# Altium footprint library ASM001-design.PcbLib: 42 footprints (part 3 of 3)
Each footprint in its own frame and in the unit in brackets; x right, y up, seen from the top. Pads: shape width x height; smd on the part's side, far side on the other; paste and mask are expansions set on the pad; w line width, h text height; cw(c..) or ccw(c..) is an arc to the next point about the centre after c.
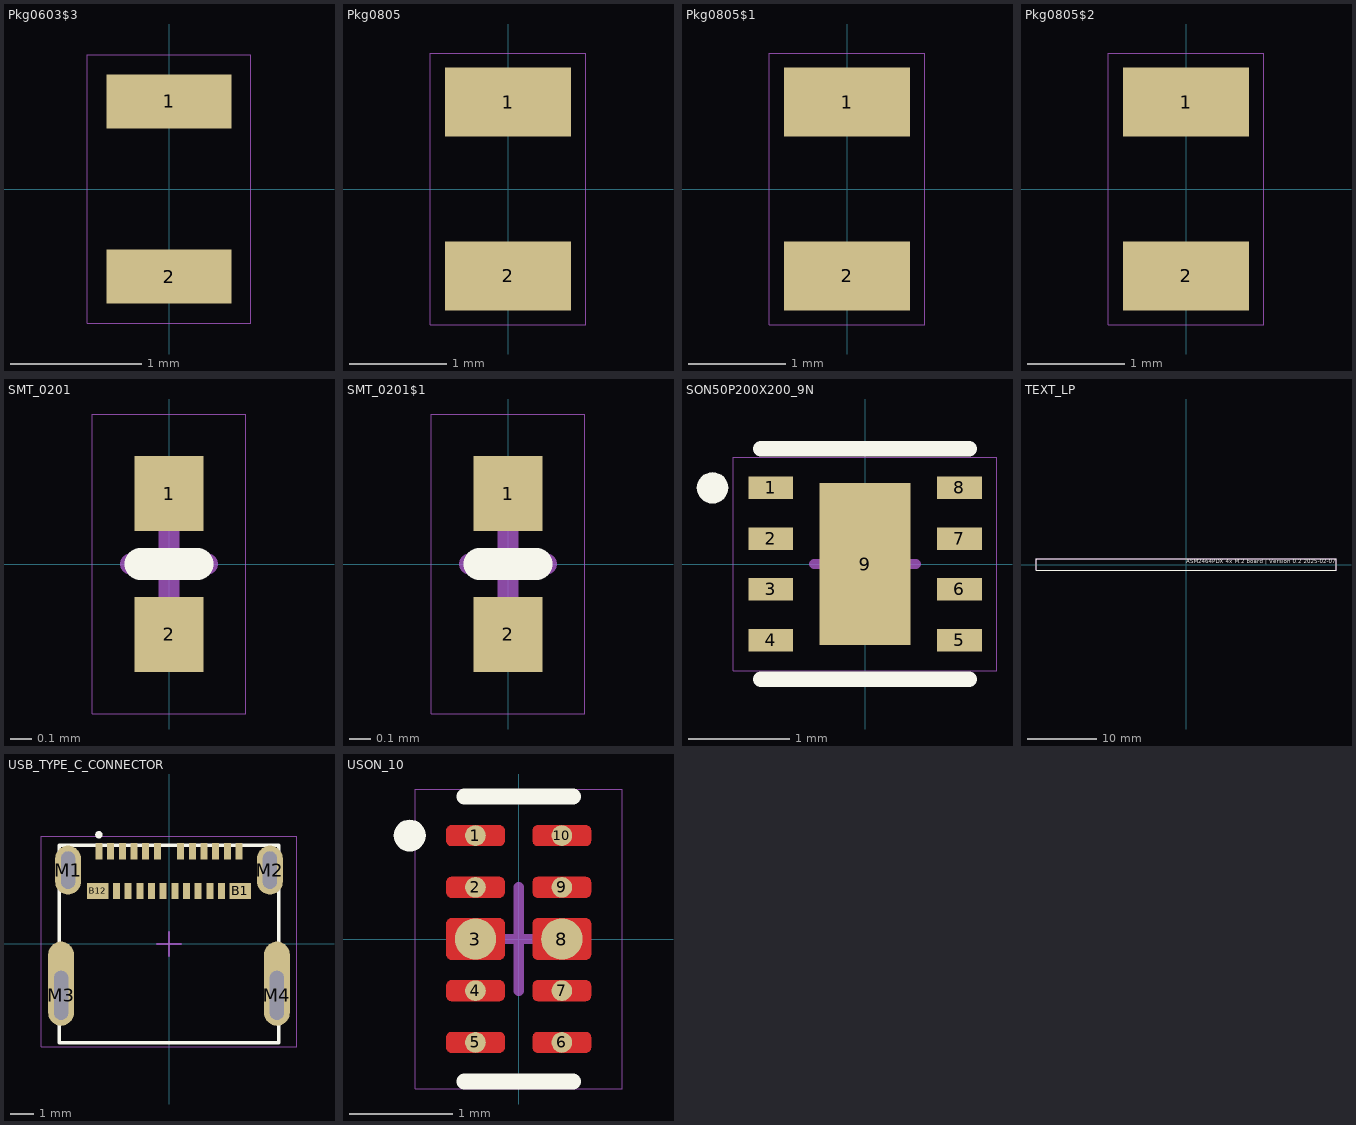
[diagram p2: the footprints below, top view; thin cyan lines are the x and y axes]

## Pkg0603$3 [mm] "Pkg0603$3"
height 1
pads (2):
  rect 0.95x0.412 smd: 1(0,0.669) 2(0,-0.669)
Mechanical 3:
  lines w0.001: -0.625,-1.025 -0.625,1.025 0.625,1.025 0.625,-1.025 -0.625,-1.025
3D body "jitx-64d1e81cb789d8dc4b8d496b.stp": height 0, standoff 0, extent -0.4,-0.8 0.4,0.8

## Pkg0805 [mm] "Pkg0805"
height 1
pads (2):
  rect 1.3x0.711 smd: 1(0,0.895) 2(0,-0.895)
Mechanical 3:
  lines w0.001: -0.8,-1.4 -0.8,1.4 0.8,1.4 0.8,-1.4 -0.8,-1.4
3D body "jitx-64d1f041b789d8dc4b8e350c.stp": height 0, standoff 0, extent -0.65,-1 0.65,1

## Pkg0805$1 [mm] "Pkg0805$1"
height 1
pads (2):
  rect 1.3x0.711 smd: 1(0,0.895) 2(0,-0.895)
Mechanical 3:
  lines w0.001: -0.8,-1.4 -0.8,1.4 0.8,1.4 0.8,-1.4 -0.8,-1.4
3D body "jitx-64d1f041b789d8dc4b8e350c.stp": height 0, standoff 0, extent -0.65,-1 0.65,1

## Pkg0805$2 [mm] "Pkg0805$2"
height 1
pads (2):
  rect 1.3x0.711 smd: 1(0,0.895) 2(0,-0.895)
Mechanical 3:
  lines w0.001: -0.8,-1.4 -0.8,1.4 0.8,1.4 0.8,-1.4 -0.8,-1.4
3D body "jitx-64d1f041b789d8dc4b8e350c.stp": height 0, standoff 0, extent -0.65,-1 0.65,1

## SMT_0201 [mm] "SMT_0201"
height 1
pads (2):
  rect 0.33x0.358 smd: 1(0,0.336) 2(0,-0.336)
Top Overlay:
  lines w0.153: -0.135,0 0.135,0
Mechanical 1:
  lines w0.1: -0.182,0 0.182,0 ; 0,-0.182 0,0.182
Mechanical 3:
  lines w0.001: -0.365,-0.715 -0.365,0.715 0.365,0.715 0.365,-0.715 -0.365,-0.715

## SMT_0201$1 [mm] "SMT_0201$1"
height 1
pads (2):
  rect 0.33x0.358 smd: 1(0,0.336) 2(0,-0.336)
Top Overlay:
  lines w0.153: -0.135,0 0.135,0
Mechanical 1:
  lines w0.1: -0.182,0 0.182,0 ; 0,-0.182 0,0.182
Mechanical 3:
  lines w0.001: -0.365,-0.715 -0.365,0.715 0.365,0.715 0.365,-0.715 -0.365,-0.715

## SON50P200X200_9N [mm] "SON50P200X200_9N"
height 1
pads (9):
  rect 0.441x0.22 smd: 1(-0.929,0.75) 2(-0.929,0.25) 3(-0.929,-0.25) 4(-0.929,-0.75) 5(0.929,-0.75) 6(0.929,-0.25) 7(0.929,0.25) 8(0.929,0.75)
  rect 0.9x1.6 smd: 9(0,0)
Top Overlay:
  region: -1.353,0.72 -1.35,0.75 -1.353,0.78 -1.362,0.809 -1.376,0.835 -1.395,0.858 -1.418,0.877 -1.444,0.891 -1.473,0.9 -1.503,0.903 -1.533,0.9 -1.562,0.891 -1.588,0.877 -1.611,0.858 -1.63,0.835 -1.644,0.809 -1.653,0.78 -1.656,0.75 -1.653,0.72 -1.644,0.691 -1.63,0.665 -1.611,0.642 -1.588,0.623 -1.562,0.609 -1.533,0.6 -1.503,0.597 -1.473,0.6 -1.444,0.609 -1.418,0.623 -1.395,0.642 -1.376,0.665 -1.362,0.691
  lines w0.153: -1.026,-1.136 1.026,-1.136 ; -1.026,1.136 1.026,1.136
Mechanical 1:
  lines w0.1: -0.5,0 0.5,0 ; 0,-0.5 0,0.5
Mechanical 3:
  lines w0.001: -1.3,-1.05 -1.3,1.05 1.3,1.05 1.3,-1.05 -1.3,-1.05

## TEXT_LP [mm] "TEXT_LP"
height 1
Top Overlay:
  lines w0.1: -21.69,-0.84 21.69,-0.84 21.69,0.84 -21.69,0.84 -21.69,-0.84
  text "ASM2464PDX 4x M.2 board | Version 0.2 2025-02-07" at 0,0 h1
Mechanical 3:
  lines w0.001: -21.69,-0.84 -21.69,0.84 21.69,0.84 21.69,-0.84 -21.69,-0.84

## USB_TYPE_C_CONNECTOR [mm] "USB_TYPE_C_CONNECTOR"
height 1
pads (28):
  rect 0.3x0.7 smd: A1(-3,3.97) A2(-2.5,3.97) A3(-2,3.97) A4(-1.5,3.97) A5(-1,3.97) A6(-0.5,3.97) A7(0.5,3.97) A8(1,3.97) A9(1.5,3.97) A10(2,3.97) A11(2.5,3.97) A12(3,3.97) B2(2.25,2.27) B3(1.75,2.27) B4(1.25,2.27) B5(0.75,2.27) B6(0.25,2.27) B7(-0.25,2.27) B8(-0.75,2.27) B9(-1.25,2.27) B10(-1.75,2.27) B11(-2.25,2.27)
  rect 0.9x0.7 smd: B1(3.05,2.27) B12(-3.05,2.27)
  oval 1.1x2.1 hole 1.6 slot 0.6 at 0 deg: M1(-4.32,3.16) M2(4.32,3.16)
  oval 1.1x3.6 hole 2.1 slot 0.6 at 0 deg copper offset 0,0.5: M3(-4.62,-2.2) M4(4.62,-2.2)
Top Overlay:
  region: -2.85,4.643 -2.847,4.673 -2.85,4.703 -2.859,4.732 -2.873,4.758 -2.892,4.781 -2.915,4.8 -2.941,4.814 -2.97,4.823 -3,4.826 -3.03,4.823 -3.059,4.814 -3.085,4.8 -3.108,4.781 -3.127,4.758 -3.141,4.732 -3.15,4.703 -3.153,4.673 -3.15,4.643 -3.141,4.614 -3.127,4.588 -3.108,4.565 -3.085,4.546 -3.059,4.532 -3.03,4.523 -3,4.52 -2.97,4.523 -2.941,4.532 -2.915,4.546 -2.892,4.565 -2.873,4.588 -2.859,4.614
  lines w0.153: -4.696,-4.226 -4.696,4.226 4.696,4.226 4.696,-4.226 -4.696,-4.226
Mechanical 1:
  lines w0.1: -0.5,0 0.5,0 ; 0,-0.5 0,0.5
Mechanical 3:
  lines w0.001: -5.47,-4.4 -5.47,4.62 5.47,4.62 5.47,-4.4 -5.47,-4.4

## USON_10 [mm] "USON_10"
height 1
pads (10):
  round 0.2 smd: 1(-0.417,1) 2(-0.417,0.5) 4(-0.417,-0.5) 5(-0.417,-1) 6(0.417,-1) 7(0.417,-0.5) 9(0.417,0.5) 10(0.417,1)
  round 0.4 smd: 3(-0.417,0) 8(0.417,0)
Top Layer:
  region: 0.7,-1.05 0.7,-0.95 0.699,-0.94 0.696,-0.931 0.692,-0.922 0.685,-0.915 0.678,-0.908 0.669,-0.904 0.66,-0.901 0.65,-0.9 0.185,-0.9 0.175,-0.901 0.166,-0.904 0.157,-0.908 0.15,-0.915 0.143,-0.922 0.139,-0.931 0.136,-0.94 0.135,-0.95 0.135,-1.05 0.136,-1.06 0.139,-1.069 0.143,-1.078 0.15,-1.085 0.157,-1.092 0.166,-1.096 0.175,-1.099 0.185,-1.1 0.65,-1.1 0.66,-1.099 0.669,-1.096 0.678,-1.092 0.685,-1.085 0.692,-1.078 0.696,-1.069 0.699,-1.06
  region: -0.135,-1.05 -0.135,-0.95 -0.136,-0.94 -0.139,-0.931 -0.143,-0.922 -0.15,-0.915 -0.157,-0.908 -0.166,-0.904 -0.175,-0.901 -0.185,-0.9 -0.65,-0.9 -0.66,-0.901 -0.669,-0.904 -0.678,-0.908 -0.685,-0.915 -0.692,-0.922 -0.696,-0.931 -0.699,-0.94 -0.7,-0.95 -0.7,-1.05 -0.699,-1.06 -0.696,-1.069 -0.692,-1.078 -0.685,-1.085 -0.678,-1.092 -0.669,-1.096 -0.66,-1.099 -0.65,-1.1 -0.185,-1.1 -0.175,-1.099 -0.166,-1.096 -0.157,-1.092 -0.15,-1.085 -0.143,-1.078 -0.139,-1.069 -0.136,-1.06
  region: 0.7,-0.55 0.7,-0.45 0.699,-0.44 0.696,-0.431 0.692,-0.422 0.685,-0.415 0.678,-0.408 0.669,-0.404 0.66,-0.401 0.65,-0.4 0.185,-0.4 0.175,-0.401 0.166,-0.404 0.157,-0.408 0.15,-0.415 0.143,-0.422 0.139,-0.431 0.136,-0.44 0.135,-0.45 0.135,-0.55 0.136,-0.56 0.139,-0.569 0.143,-0.578 0.15,-0.585 0.157,-0.592 0.166,-0.596 0.175,-0.599 0.185,-0.6 0.65,-0.6 0.66,-0.599 0.669,-0.596 0.678,-0.592 0.685,-0.585 0.692,-0.578 0.696,-0.569 0.699,-0.56
  region: -0.135,-0.55 -0.135,-0.45 -0.136,-0.44 -0.139,-0.431 -0.143,-0.422 -0.15,-0.415 -0.157,-0.408 -0.166,-0.404 -0.175,-0.401 -0.185,-0.4 -0.65,-0.4 -0.66,-0.401 -0.669,-0.404 -0.678,-0.408 -0.685,-0.415 -0.692,-0.422 -0.696,-0.431 -0.699,-0.44 -0.7,-0.45 -0.7,-0.55 -0.699,-0.56 -0.696,-0.569 -0.692,-0.578 -0.685,-0.585 -0.678,-0.592 -0.669,-0.596 -0.66,-0.599 -0.65,-0.6 -0.185,-0.6 -0.175,-0.599 -0.166,-0.596 -0.157,-0.592 -0.15,-0.585 -0.143,-0.578 -0.139,-0.569 -0.136,-0.56
  region: 0.7,-0.15 0.7,0.15 0.699,0.16 0.696,0.169 0.692,0.178 0.685,0.185 0.678,0.192 0.669,0.196 0.66,0.199 0.65,0.2 0.185,0.2 0.175,0.199 0.166,0.196 0.157,0.192 0.15,0.185 0.143,0.178 0.139,0.169 0.136,0.16 0.135,0.15 0.135,-0.15 0.136,-0.16 0.139,-0.169 0.143,-0.178 0.15,-0.185 0.157,-0.192 0.166,-0.196 0.175,-0.199 0.185,-0.2 0.65,-0.2 0.66,-0.199 0.669,-0.196 0.678,-0.192 0.685,-0.185 0.692,-0.178 0.696,-0.169 0.699,-0.16
  region: -0.135,-0.15 -0.135,0.15 -0.136,0.16 -0.139,0.169 -0.143,0.178 -0.15,0.185 -0.157,0.192 -0.166,0.196 -0.175,0.199 -0.185,0.2 -0.65,0.2 -0.66,0.199 -0.669,0.196 -0.678,0.192 -0.685,0.185 -0.692,0.178 -0.696,0.169 -0.699,0.16 -0.7,0.15 -0.7,-0.15 -0.699,-0.16 -0.696,-0.169 -0.692,-0.178 -0.685,-0.185 -0.678,-0.192 -0.669,-0.196 -0.66,-0.199 -0.65,-0.2 -0.185,-0.2 -0.175,-0.199 -0.166,-0.196 -0.157,-0.192 -0.15,-0.185 -0.143,-0.178 -0.139,-0.169 -0.136,-0.16
  region: 0.7,0.45 0.7,0.55 0.699,0.56 0.696,0.569 0.692,0.578 0.685,0.585 0.678,0.592 0.669,0.596 0.66,0.599 0.65,0.6 0.185,0.6 0.175,0.599 0.166,0.596 0.157,0.592 0.15,0.585 0.143,0.578 0.139,0.569 0.136,0.56 0.135,0.55 0.135,0.45 0.136,0.44 0.139,0.431 0.143,0.422 0.15,0.415 0.157,0.408 0.166,0.404 0.175,0.401 0.185,0.4 0.65,0.4 0.66,0.401 0.669,0.404 0.678,0.408 0.685,0.415 0.692,0.422 0.696,0.431 0.699,0.44
  region: -0.135,0.45 -0.135,0.55 -0.136,0.56 -0.139,0.569 -0.143,0.578 -0.15,0.585 -0.157,0.592 -0.166,0.596 -0.175,0.599 -0.185,0.6 -0.65,0.6 -0.66,0.599 -0.669,0.596 -0.678,0.592 -0.685,0.585 -0.692,0.578 -0.696,0.569 -0.699,0.56 -0.7,0.55 -0.7,0.45 -0.699,0.44 -0.696,0.431 -0.692,0.422 -0.685,0.415 -0.678,0.408 -0.669,0.404 -0.66,0.401 -0.65,0.4 -0.185,0.4 -0.175,0.401 -0.166,0.404 -0.157,0.408 -0.15,0.415 -0.143,0.422 -0.139,0.431 -0.136,0.44
  region: 0.7,0.95 0.7,1.05 0.699,1.06 0.696,1.069 0.692,1.078 0.685,1.085 0.678,1.092 0.669,1.096 0.66,1.099 0.65,1.1 0.185,1.1 0.175,1.099 0.166,1.096 0.157,1.092 0.15,1.085 0.143,1.078 0.139,1.069 0.136,1.06 0.135,1.05 0.135,0.95 0.136,0.94 0.139,0.931 0.143,0.922 0.15,0.915 0.157,0.908 0.166,0.904 0.175,0.901 0.185,0.9 0.65,0.9 0.66,0.901 0.669,0.904 0.678,0.908 0.685,0.915 0.692,0.922 0.696,0.931 0.699,0.94
  region: -0.135,0.95 -0.135,1.05 -0.136,1.06 -0.139,1.069 -0.143,1.078 -0.15,1.085 -0.157,1.092 -0.166,1.096 -0.175,1.099 -0.185,1.1 -0.65,1.1 -0.66,1.099 -0.669,1.096 -0.678,1.092 -0.685,1.085 -0.692,1.078 -0.696,1.069 -0.699,1.06 -0.7,1.05 -0.7,0.95 -0.699,0.94 -0.696,0.931 -0.692,0.922 -0.685,0.915 -0.678,0.908 -0.669,0.904 -0.66,0.901 -0.65,0.9 -0.185,0.9 -0.175,0.901 -0.166,0.904 -0.157,0.908 -0.15,0.915 -0.143,0.922 -0.139,0.931 -0.136,0.94
Top Overlay:
  region: -0.903,0.97 -0.9,1 -0.903,1.03 -0.912,1.059 -0.926,1.085 -0.945,1.108 -0.968,1.127 -0.994,1.141 -1.023,1.15 -1.053,1.153 -1.083,1.15 -1.112,1.141 -1.138,1.127 -1.161,1.108 -1.18,1.085 -1.194,1.059 -1.203,1.03 -1.206,1 -1.203,0.97 -1.194,0.941 -1.18,0.915 -1.161,0.892 -1.138,0.873 -1.112,0.859 -1.083,0.85 -1.053,0.847 -1.023,0.85 -0.994,0.859 -0.968,0.873 -0.945,0.892 -0.926,0.915 -0.912,0.941
  lines w0.153: -0.526,-1.376 0.526,-1.376 ; -0.526,1.376 0.526,1.376
Mechanical 1:
  lines w0.1: -0.5,0 0.5,0 ; 0,-0.5 0,0.5
Mechanical 3:
  lines w0.001: -1,-1.45 -1,1.45 1,1.45 1,-1.45 -1,-1.45